# Altium schematic symbol library jlcpcb_2025_04_resistors_extended_0201.schlib: 1508 symbols (part 6 of 8) (continued)
## RC-01W5362FT (continued)

## RC-01W5490FT
designator R?  Resistance: 549Ω  (hidden comment: *)
Resistor, 549Ω, ±1%, 50mW, ±200ppm/℃, -55℃~+125℃, SMD 0201; Manufacturer: Uniroyal; Manufacturer Part Number: RC-01W5490FT; Supplier 1: LCSC; Supplier Part Number 1: C320954; JLCPCB Part Number: C320954; Power Rating: 50mW; Category: Resistors; Package Size: 0201; JLCPCB Basic Part: Yes; Tolerance: ±1%; Temperature Coefficient: ±200ppm/℃; Temperature Rating: -55℃~+125℃; ComponentLink1Description: Datasheet; ComponentLink1URL: https://wmsc.lcsc.com/wmsc/upload/file/pdf/v2/lcsc/2110191430_FH--Guangdong-Fenghua-Advanced-Tech-RC-01W5490FT_C320954.pdf; ComponentLink2Description: JLCPCB Part URL; ComponentLink2URL: https://jlcpcb.com/partdetail/C320954
pins: 1, 2
1 alternate drawing of the same symbol

## RC-01W5600FT
designator R?  Resistance: 560Ω  (hidden comment: *)
Resistor, 560Ω, ±1%, 50mW, 25V, ±200ppm/℃, -55℃~+125℃, SMD 0201; Manufacturer: Uniroyal; Manufacturer Part Number: RC-01W5600FT; Supplier 1: LCSC; Supplier Part Number 1: C320959; JLCPCB Part Number: C320959; Power Rating: 50mW; Category: Resistors; Package Size: 0201; JLCPCB Basic Part: Yes; Tolerance: ±1%; Voltage Rating: 25V; Temperature Coefficient: ±200ppm/℃; Temperature Rating: -55℃~+125℃; ComponentLink1Description: Datasheet; ComponentLink1URL: https://wmsc.lcsc.com/wmsc/upload/file/pdf/v2/lcsc/2304140030_FH--Guangdong-Fenghua-Advanced-Tech-RC-01W5600FT_C320959.pdf; ComponentLink2Description: JLCPCB Part URL; ComponentLink2URL: https://jlcpcb.com/partdetail/C320959
pins: 1, 2
1 alternate drawing of the same symbol

## RC-01W5620FT
designator R?  Resistance: 562Ω  (hidden comment: *)
Resistor, 562Ω, ±1%, 50mW, 25V, ±200ppm/℃, -55℃~+125℃, SMD 0201; Manufacturer: Uniroyal; Manufacturer Part Number: RC-01W5620FT; Supplier 1: LCSC; Supplier Part Number 1: C320964; JLCPCB Part Number: C320964; Power Rating: 50mW; Category: Resistors; Package Size: 0201; JLCPCB Basic Part: Yes; Tolerance: ±1%; Voltage Rating: 25V; Temperature Coefficient: ±200ppm/℃; Temperature Rating: -55℃~+125℃; ComponentLink1Description: Datasheet; ComponentLink1URL: https://wmsc.lcsc.com/wmsc/upload/file/pdf/v2/lcsc/2304140030_FH--Guangdong-Fenghua-Advanced-Tech-RC-01W5620FT_C320964.pdf; ComponentLink2Description: JLCPCB Part URL; ComponentLink2URL: https://jlcpcb.com/partdetail/C320964
pins: 1, 2
1 alternate drawing of the same symbol

## RC-01W5622FT
designator R?  Resistance: 56.2kΩ  (hidden comment: *)
Resistor, 56.2kΩ, ±1%, 50mW, 25V, ±200ppm/℃, -55℃~+125℃, SMD 0201; Manufacturer: Uniroyal; Manufacturer Part Number: RC-01W5622FT; Supplier 1: LCSC; Supplier Part Number 1: C320966; JLCPCB Part Number: C320966; Power Rating: 50mW; Category: Resistors; Package Size: 0201; JLCPCB Basic Part: Yes; Tolerance: ±1%; Voltage Rating: 25V; Temperature Coefficient: ±200ppm/℃; Temperature Rating: -55℃~+125℃; ComponentLink1Description: Datasheet; ComponentLink1URL: https://wmsc.lcsc.com/wmsc/upload/file/pdf/v2/lcsc/2304140030_FH--Guangdong-Fenghua-Advanced-Tech-RC-01W5622FT_C320966.pdf; ComponentLink2Description: JLCPCB Part URL; ComponentLink2URL: https://jlcpcb.com/partdetail/C320966
pins: 1, 2
1 alternate drawing of the same symbol

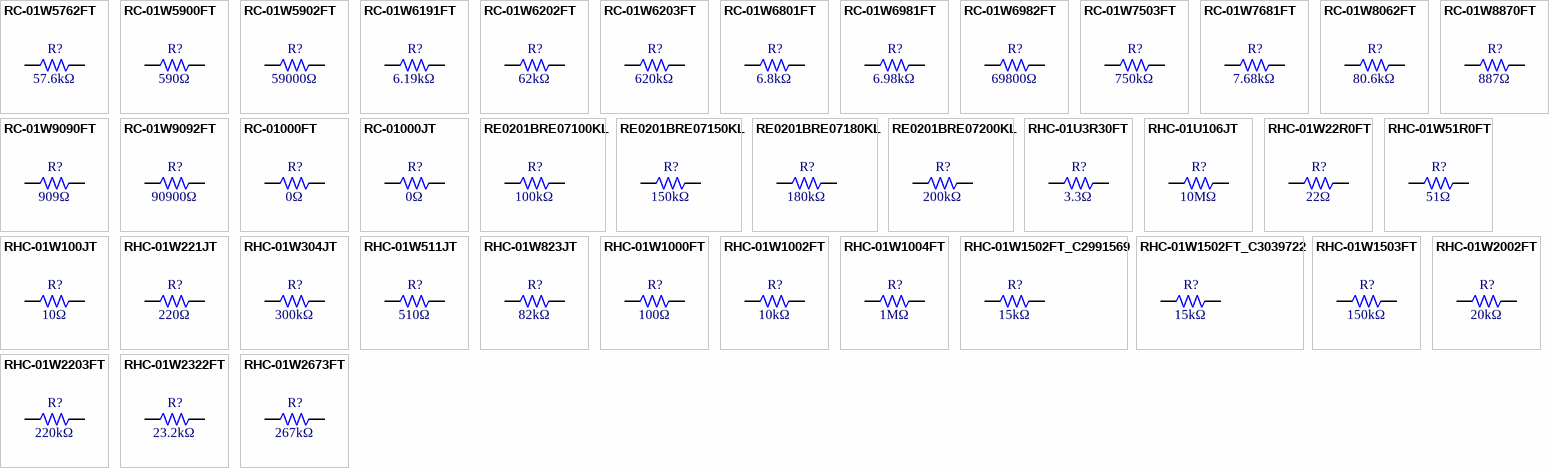
[diagram p27: symbols RC-01W5762FT to RHC-01W2673FT]

## RC-01W5762FT
designator R?  Resistance: 57.6kΩ  (hidden comment: *)
Resistor, 57.6kΩ, ±1%, 50mW, 25V, ±200ppm/℃, -55℃~+125℃, SMD 0201; Manufacturer: Uniroyal; Manufacturer Part Number: RC-01W5762FT; Supplier 1: LCSC; Supplier Part Number 1: C320974; JLCPCB Part Number: C320974; Power Rating: 50mW; Category: Resistors; Package Size: 0201; JLCPCB Basic Part: Yes; Tolerance: ±1%; Voltage Rating: 25V; Temperature Coefficient: ±200ppm/℃; Temperature Rating: -55℃~+125℃; ComponentLink1Description: Datasheet; ComponentLink1URL: https://wmsc.lcsc.com/wmsc/upload/file/pdf/v2/lcsc/2304140030_FH--Guangdong-Fenghua-Advanced-Tech-RC-01W5762FT_C320974.pdf; ComponentLink2Description: JLCPCB Part URL; ComponentLink2URL: https://jlcpcb.com/partdetail/C320974
pins: 1, 2
1 alternate drawing of the same symbol

## RC-01W5900FT
designator R?  Resistance: 590Ω  (hidden comment: *)
Resistor, 590Ω, ±1%, 50mW, ±200ppm/℃, -55℃~+125℃, SMD 0201; Manufacturer: Uniroyal; Manufacturer Part Number: RC-01W5900FT; Supplier 1: LCSC; Supplier Part Number 1: C320976; JLCPCB Part Number: C320976; Power Rating: 50mW; Category: Resistors; Package Size: 0201; JLCPCB Basic Part: Yes; Tolerance: ±1%; Temperature Coefficient: ±200ppm/℃; Temperature Rating: -55℃~+125℃; ComponentLink1Description: Datasheet; ComponentLink1URL: https://wmsc.lcsc.com/wmsc/upload/file/pdf/v2/lcsc/2202211530_FH--Guangdong-Fenghua-Advanced-Tech-RC-01W5900FT_C320976.pdf; ComponentLink2Description: JLCPCB Part URL; ComponentLink2URL: https://jlcpcb.com/partdetail/C320976
pins: 1, 2
1 alternate drawing of the same symbol

## RC-01W5902FT
designator R?  Resistance: 59000Ω  (hidden comment: *)
Resistor, 59000Ω, ±1%, 50mW, ±200ppm/℃, -55℃~+125℃, SMD 0201; Manufacturer: Uniroyal; Manufacturer Part Number: RC-01W5902FT; Supplier 1: LCSC; Supplier Part Number 1: C320978; JLCPCB Part Number: C320978; Power Rating: 50mW; Category: Resistors; Package Size: 0201; JLCPCB Basic Part: Yes; Tolerance: ±1%; Temperature Coefficient: ±200ppm/℃; Temperature Rating: -55℃~+125℃; ComponentLink1Description: Datasheet; ComponentLink1URL: https://wmsc.lcsc.com/wmsc/upload/file/pdf/v2/lcsc/2110191430_FH--Guangdong-Fenghua-Advanced-Tech-RC-01W5902FT_C320978.pdf; ComponentLink2Description: JLCPCB Part URL; ComponentLink2URL: https://jlcpcb.com/partdetail/C320978
pins: 1, 2
1 alternate drawing of the same symbol

## RC-01W6191FT
designator R?  Resistance: 6.19kΩ  (hidden comment: *)
Resistor, 6.19kΩ, ±1%, 50mW, 25V, ±200ppm/℃, -55℃~+125℃, SMD 0201; Manufacturer: Uniroyal; Manufacturer Part Number: RC-01W6191FT; Supplier 1: LCSC; Supplier Part Number 1: C320984; JLCPCB Part Number: C320984; Power Rating: 50mW; Category: Resistors; Package Size: 0201; JLCPCB Basic Part: Yes; Tolerance: ±1%; Voltage Rating: 25V; Temperature Coefficient: ±200ppm/℃; Temperature Rating: -55℃~+125℃; ComponentLink1Description: Datasheet; ComponentLink1URL: https://wmsc.lcsc.com/wmsc/upload/file/pdf/v2/lcsc/2304140030_FH--Guangdong-Fenghua-Advanced-Tech-RC-01W6191FT_C320984.pdf; ComponentLink2Description: JLCPCB Part URL; ComponentLink2URL: https://jlcpcb.com/partdetail/C320984
pins: 1, 2
1 alternate drawing of the same symbol

## RC-01W6202FT
designator R?  Resistance: 62kΩ  (hidden comment: *)
Resistor, 62kΩ, ±1%, 50mW, 25V, ±200ppm/℃, -55℃~+125℃, SMD 0201; Manufacturer: Uniroyal; Manufacturer Part Number: RC-01W6202FT; Supplier 1: LCSC; Supplier Part Number 1: C320989; JLCPCB Part Number: C320989; Power Rating: 50mW; Category: Resistors; Package Size: 0201; JLCPCB Basic Part: Yes; Tolerance: ±1%; Voltage Rating: 25V; Temperature Coefficient: ±200ppm/℃; Temperature Rating: -55℃~+125℃; ComponentLink1Description: Datasheet; ComponentLink1URL: https://wmsc.lcsc.com/wmsc/upload/file/pdf/v2/lcsc/2304140030_FH--Guangdong-Fenghua-Advanced-Tech-RC-01W6202FT_C320989.pdf; ComponentLink2Description: JLCPCB Part URL; ComponentLink2URL: https://jlcpcb.com/partdetail/C320989
pins: 1, 2
1 alternate drawing of the same symbol

## RC-01W6203FT
designator R?  Resistance: 620kΩ  (hidden comment: *)
Resistor, 620kΩ, ±1%, 50mW, 25V, ±200ppm/℃, -55℃~+125℃, SMD 0201; Manufacturer: Uniroyal; Manufacturer Part Number: RC-01W6203FT; Supplier 1: LCSC; Supplier Part Number 1: C320990; JLCPCB Part Number: C320990; Power Rating: 50mW; Category: Resistors; Package Size: 0201; JLCPCB Basic Part: Yes; Tolerance: ±1%; Voltage Rating: 25V; Temperature Coefficient: ±200ppm/℃; Temperature Rating: -55℃~+125℃; ComponentLink1Description: Datasheet; ComponentLink1URL: https://wmsc.lcsc.com/wmsc/upload/file/pdf/v2/lcsc/2304140030_FH--Guangdong-Fenghua-Advanced-Tech-RC-01W6203FT_C320990.pdf; ComponentLink2Description: JLCPCB Part URL; ComponentLink2URL: https://jlcpcb.com/partdetail/C320990
pins: 1, 2
1 alternate drawing of the same symbol

## RC-01W6801FT
designator R?  Resistance: 6.8kΩ  (hidden comment: *)
Resistor, 6.8kΩ, ±1%, 50mW, 25V, ±200ppm/℃, -55℃~+125℃, SMD 0201; Manufacturer: Uniroyal; Manufacturer Part Number: RC-01W6801FT; Supplier 1: LCSC; Supplier Part Number 1: C321006; JLCPCB Part Number: C321006; Power Rating: 50mW; Category: Resistors; Package Size: 0201; JLCPCB Basic Part: Yes; Tolerance: ±1%; Voltage Rating: 25V; Temperature Coefficient: ±200ppm/℃; Temperature Rating: -55℃~+125℃; ComponentLink1Description: Datasheet; ComponentLink1URL: https://wmsc.lcsc.com/wmsc/upload/file/pdf/v2/lcsc/2304140030_FH--Guangdong-Fenghua-Advanced-Tech-RC-01W6801FT_C321006.pdf; ComponentLink2Description: JLCPCB Part URL; ComponentLink2URL: https://jlcpcb.com/partdetail/C321006
pins: 1, 2
1 alternate drawing of the same symbol

## RC-01W6981FT
designator R?  Resistance: 6.98kΩ  (hidden comment: *)
Resistor, 6.98kΩ, ±1%, 50mW, 25V, ±200ppm/℃, -55℃~+125℃, SMD 0201; Manufacturer: Uniroyal; Manufacturer Part Number: RC-01W6981FT; Supplier 1: LCSC; Supplier Part Number 1: C321018; JLCPCB Part Number: C321018; Power Rating: 50mW; Category: Resistors; Package Size: 0201; JLCPCB Basic Part: Yes; Tolerance: ±1%; Voltage Rating: 25V; Temperature Coefficient: ±200ppm/℃; Temperature Rating: -55℃~+125℃; ComponentLink1Description: Datasheet; ComponentLink1URL: https://wmsc.lcsc.com/wmsc/upload/file/pdf/v2/lcsc/2304140030_FH--Guangdong-Fenghua-Advanced-Tech-RC-01W6981FT_C321018.pdf; ComponentLink2Description: JLCPCB Part URL; ComponentLink2URL: https://jlcpcb.com/partdetail/C321018
pins: 1, 2
1 alternate drawing of the same symbol

## RC-01W6982FT
designator R?  Resistance: 69800Ω  (hidden comment: *)
Resistor, 69800Ω, ±1%, 50mW, ±200ppm/℃, -55℃~+125℃, SMD 0201; Manufacturer: Uniroyal; Manufacturer Part Number: RC-01W6982FT; Supplier 1: LCSC; Supplier Part Number 1: C321019; JLCPCB Part Number: C321019; Power Rating: 50mW; Category: Resistors; Package Size: 0201; JLCPCB Basic Part: Yes; Tolerance: ±1%; Temperature Coefficient: ±200ppm/℃; Temperature Rating: -55℃~+125℃; ComponentLink1Description: Datasheet; ComponentLink1URL: https://wmsc.lcsc.com/wmsc/upload/file/pdf/v2/lcsc/2202211530_FH--Guangdong-Fenghua-Advanced-Tech-RC-01W6982FT_C321019.pdf; ComponentLink2Description: JLCPCB Part URL; ComponentLink2URL: https://jlcpcb.com/partdetail/C321019
pins: 1, 2
1 alternate drawing of the same symbol

## RC-01W7503FT
designator R?  Resistance: 750kΩ  (hidden comment: *)
Resistor, 750kΩ, ±1%, 50mW, 25V, ±200ppm/℃, -55℃~+125℃, SMD 0201; Manufacturer: Uniroyal; Manufacturer Part Number: RC-01W7503FT; Supplier 1: LCSC; Supplier Part Number 1: C321031; JLCPCB Part Number: C321031; Power Rating: 50mW; Category: Resistors; Package Size: 0201; JLCPCB Basic Part: Yes; Tolerance: ±1%; Voltage Rating: 25V; Temperature Coefficient: ±200ppm/℃; Temperature Rating: -55℃~+125℃; ComponentLink1Description: Datasheet; ComponentLink1URL: https://wmsc.lcsc.com/wmsc/upload/file/pdf/v2/lcsc/2304140030_FH--Guangdong-Fenghua-Advanced-Tech-RC-01W7503FT_C321031.pdf; ComponentLink2Description: JLCPCB Part URL; ComponentLink2URL: https://jlcpcb.com/partdetail/C321031
pins: 1, 2
1 alternate drawing of the same symbol

## RC-01W7681FT
designator R?  Resistance: 7.68kΩ  (hidden comment: *)
Resistor, 7.68kΩ, ±1%, ±200ppm/℃, SMD 0201; Manufacturer: Uniroyal; Manufacturer Part Number: RC-01W7681FT; Supplier 1: LCSC; Supplier Part Number 1: C321038; JLCPCB Part Number: C321038; Category: Resistors; Package Size: 0201; JLCPCB Basic Part: Yes; Tolerance: ±1%; Temperature Coefficient: ±200ppm/℃; ComponentLink1Description: Datasheet; ComponentLink1URL: https://wmsc.lcsc.com/wmsc/upload/file/pdf/v2/lcsc/2206282015_FH--Guangdong-Fenghua-Advanced-Tech-RC-01W7681FT_C321038.pdf; ComponentLink2Description: JLCPCB Part URL; ComponentLink2URL: https://jlcpcb.com/partdetail/C321038
pins: 1, 2
1 alternate drawing of the same symbol

## RC-01W8062FT
designator R?  Resistance: 80.6kΩ  (hidden comment: *)
Resistor, 80.6kΩ, ±1%, 50mW, 25V, ±200ppm/℃, -55℃~+125℃, SMD 0201; Manufacturer: Uniroyal; Manufacturer Part Number: RC-01W8062FT; Supplier 1: LCSC; Supplier Part Number 1: C321047; JLCPCB Part Number: C321047; Power Rating: 50mW; Category: Resistors; Package Size: 0201; JLCPCB Basic Part: Yes; Tolerance: ±1%; Voltage Rating: 25V; Temperature Coefficient: ±200ppm/℃; Temperature Rating: -55℃~+125℃; ComponentLink1Description: Datasheet; ComponentLink1URL: https://wmsc.lcsc.com/wmsc/upload/file/pdf/v2/lcsc/2304140030_FH--Guangdong-Fenghua-Advanced-Tech-RC-01W8062FT_C321047.pdf; ComponentLink2Description: JLCPCB Part URL; ComponentLink2URL: https://jlcpcb.com/partdetail/C321047
pins: 1, 2
1 alternate drawing of the same symbol

## RC-01W8870FT
designator R?  Resistance: 887Ω  (hidden comment: *)
Resistor, 887Ω, ±1%, ±200ppm/℃, SMD 0201; Manufacturer: Uniroyal; Manufacturer Part Number: RC-01W8870FT; Supplier 1: LCSC; Supplier Part Number 1: C321073; JLCPCB Part Number: C321073; Category: Resistors; Package Size: 0201; JLCPCB Basic Part: Yes; Tolerance: ±1%; Temperature Coefficient: ±200ppm/℃; ComponentLink1Description: Datasheet; ComponentLink1URL: https://wmsc.lcsc.com/wmsc/upload/file/pdf/v2/lcsc/2204121100_FH--Guangdong-Fenghua-Advanced-Tech-RC-01W8870FT_C321073.pdf; ComponentLink2Description: JLCPCB Part URL; ComponentLink2URL: https://jlcpcb.com/partdetail/C321073
pins: 1, 2
1 alternate drawing of the same symbol

## RC-01W9090FT
designator R?  Resistance: 909Ω  (hidden comment: *)
Resistor, 909Ω, ±1%, 50mW, 25V, ±200ppm/℃, -55℃~+125℃, SMD 0201; Manufacturer: Uniroyal; Manufacturer Part Number: RC-01W9090FT; Supplier 1: LCSC; Supplier Part Number 1: C321078; JLCPCB Part Number: C321078; Power Rating: 50mW; Category: Resistors; Package Size: 0201; JLCPCB Basic Part: Yes; Tolerance: ±1%; Voltage Rating: 25V; Temperature Coefficient: ±200ppm/℃; Temperature Rating: -55℃~+125℃; ComponentLink1Description: Datasheet; ComponentLink1URL: https://wmsc.lcsc.com/wmsc/upload/file/pdf/v2/lcsc/2304140030_FH--Guangdong-Fenghua-Advanced-Tech-RC-01W9090FT_C321078.pdf; ComponentLink2Description: JLCPCB Part URL; ComponentLink2URL: https://jlcpcb.com/partdetail/C321078
pins: 1, 2
1 alternate drawing of the same symbol

## RC-01W9092FT
designator R?  Resistance: 90900Ω  (hidden comment: *)
Resistor, 90900Ω, ±1%, 50mW, 25V, ±200ppm/℃, -55℃~+125℃, SMD 0201; Manufacturer: Uniroyal; Manufacturer Part Number: RC-01W9092FT; Supplier 1: LCSC; Supplier Part Number 1: C321080; JLCPCB Part Number: C321080; Power Rating: 50mW; Category: Resistors; Package Size: 0201; JLCPCB Basic Part: Yes; Tolerance: ±1%; Voltage Rating: 25V; Temperature Coefficient: ±200ppm/℃; Temperature Rating: -55℃~+125℃; ComponentLink1Description: Datasheet; ComponentLink1URL: https://wmsc.lcsc.com/wmsc/upload/file/pdf/v2/lcsc/2304140030_FH--Guangdong-Fenghua-Advanced-Tech-RC-01W9092FT_C321080.pdf; ComponentLink2Description: JLCPCB Part URL; ComponentLink2URL: https://jlcpcb.com/partdetail/C321080
pins: 1, 2
1 alternate drawing of the same symbol

## RC-01000FT
designator R?  Resistance: 0Ω  (hidden comment: *)
Resistor, 0Ω, ±1%, 50mW, 25V, -55℃~+125℃, SMD 0201; Manufacturer: Uniroyal; Manufacturer Part Number: RC-01000FT; Supplier 1: LCSC; Supplier Part Number 1: C320450; JLCPCB Part Number: C320450; Power Rating: 50mW; Category: Resistors; Package Size: 0201; JLCPCB Basic Part: Yes; Tolerance: ±1%; Voltage Rating: 25V; Temperature Rating: -55℃~+125℃; ComponentLink1Description: Datasheet; ComponentLink1URL: https://wmsc.lcsc.com/wmsc/upload/file/pdf/v2/lcsc/2304140030_FH--Guangdong-Fenghua-Advanced-Tech-RC-01000FT_C320450.pdf; ComponentLink2Description: JLCPCB Part URL; ComponentLink2URL: https://jlcpcb.com/partdetail/C320450
pins: 1, 2
1 alternate drawing of the same symbol

## RC-01000JT
designator R?  Resistance: 0Ω  (hidden comment: *)
Resistor, 0Ω, ±5%, 50mW, 25V, -55℃~+125℃, SMD 0201; Manufacturer: Uniroyal; Manufacturer Part Number: RC-01000JT; Supplier 1: LCSC; Supplier Part Number 1: C310170; JLCPCB Part Number: C310170; Power Rating: 50mW; Category: Resistors; Package Size: 0201; JLCPCB Basic Part: Yes; Tolerance: ±5%; Voltage Rating: 25V; Temperature Rating: -55℃~+125℃; ComponentLink1Description: Datasheet; ComponentLink1URL: https://wmsc.lcsc.com/wmsc/upload/file/pdf/v2/lcsc/2406111438_FH--Guangdong-Fenghua-Advanced-Tech-RC-01000JT_C310170.pdf; ComponentLink2Description: JLCPCB Part URL; ComponentLink2URL: https://jlcpcb.com/partdetail/C310170
pins: 1, 2
1 alternate drawing of the same symbol

## RE0201BRE07100KL
designator R?  Resistance: 100kΩ  (hidden comment: *)
Resistor, 100kΩ, ±0.1%, 50mW, 25V, ±50ppm/℃, -55℃~+155℃, SMD 0201; Manufacturer: Uniroyal; Manufacturer Part Number: RE0201BRE07100KL; Supplier 1: LCSC; Supplier Part Number 1: C1882654; JLCPCB Part Number: C1882654; Power Rating: 50mW; Category: Resistors; Package Size: 0201; JLCPCB Basic Part: Yes; Tolerance: ±0.1%; Voltage Rating: 25V; Temperature Coefficient: ±50ppm/℃; Temperature Rating: -55℃~+155℃; ComponentLink1Description: Datasheet; ComponentLink1URL: https://wmsc.lcsc.com/wmsc/upload/file/pdf/v2/lcsc/2201280400_YAGEO-RE0201BRE07100KL_C1882654.pdf; ComponentLink2Description: JLCPCB Part URL; ComponentLink2URL: https://jlcpcb.com/partdetail/C1882654
pins: 1, 2
1 alternate drawing of the same symbol

## RE0201BRE07150KL
designator R?  Resistance: 150kΩ  (hidden comment: *)
Resistor, 150kΩ, ±0.1%, 50mW, 25V, ±50ppm/℃, -55℃~+155℃, SMD 0201; Manufacturer: Uniroyal; Manufacturer Part Number: RE0201BRE07150KL; Supplier 1: LCSC; Supplier Part Number 1: C2145638; JLCPCB Part Number: C2145638; Power Rating: 50mW; Category: Resistors; Package Size: 0201; JLCPCB Basic Part: Yes; Tolerance: ±0.1%; Voltage Rating: 25V; Temperature Coefficient: ±50ppm/℃; Temperature Rating: -55℃~+155℃; ComponentLink1Description: Datasheet; ComponentLink1URL: https://wmsc.lcsc.com/wmsc/upload/file/pdf/v2/lcsc/2202031530_YAGEO-RE0201BRE07150KL_C2145638.pdf; ComponentLink2Description: JLCPCB Part URL; ComponentLink2URL: https://jlcpcb.com/partdetail/C2145638
pins: 1, 2
1 alternate drawing of the same symbol

## RE0201BRE07180KL
designator R?  Resistance: 180kΩ  (hidden comment: *)
Resistor, 180kΩ, ±0.1%, 50mW, 25V, ±50ppm/℃, -55℃~+155℃, SMD 0201; Manufacturer: Uniroyal; Manufacturer Part Number: RE0201BRE07180KL; Supplier 1: LCSC; Supplier Part Number 1: C2936622; JLCPCB Part Number: C2936622; Power Rating: 50mW; Category: Resistors; Package Size: 0201; JLCPCB Basic Part: Yes; Tolerance: ±0.1%; Voltage Rating: 25V; Temperature Coefficient: ±50ppm/℃; Temperature Rating: -55℃~+155℃; ComponentLink1Description: Datasheet; ComponentLink1URL: https://wmsc.lcsc.com/wmsc/upload/file/pdf/v2/lcsc/2201121730_YAGEO-RE0201BRE07180KL_C2936622.pdf; ComponentLink2Description: JLCPCB Part URL; ComponentLink2URL: https://jlcpcb.com/partdetail/C2936622
pins: 1, 2
1 alternate drawing of the same symbol

## RE0201BRE07200KL
designator R?  Resistance: 200kΩ  (hidden comment: *)
Resistor, 200kΩ, ±0.1%, 50mW, 25V, ±50ppm/℃, -55℃~+155℃, SMD 0201; Manufacturer: Uniroyal; Manufacturer Part Number: RE0201BRE07200KL; Supplier 1: LCSC; Supplier Part Number 1: C2088422; JLCPCB Part Number: C2088422; Power Rating: 50mW; Category: Resistors; Package Size: 0201; JLCPCB Basic Part: Yes; Tolerance: ±0.1%; Voltage Rating: 25V; Temperature Coefficient: ±50ppm/℃; Temperature Rating: -55℃~+155℃; ComponentLink1Description: Datasheet; ComponentLink1URL: https://wmsc.lcsc.com/wmsc/upload/file/pdf/v2/lcsc/2202020100_YAGEO-RE0201BRE07200KL_C2088422.pdf; ComponentLink2Description: JLCPCB Part URL; ComponentLink2URL: https://jlcpcb.com/partdetail/C2088422
pins: 1, 2
1 alternate drawing of the same symbol

## RHC-01U3R30FT
designator R?  Resistance: 3.3Ω  (hidden comment: *)
Resistor, 3.3Ω, ±1%, ±400ppm/℃, SMD 0201; Manufacturer: Uniroyal; Manufacturer Part Number: RHC-01U3R30FT; Supplier 1: LCSC; Supplier Part Number 1: C4354887; JLCPCB Part Number: C4354887; Category: Resistors; Package Size: 0201; JLCPCB Basic Part: Yes; Tolerance: ±1%; Temperature Coefficient: ±400ppm/℃; ComponentLink1Description: Datasheet; ComponentLink1URL: https://wmsc.lcsc.com/wmsc/upload/file/pdf/v2/lcsc/2207131800_FH--Guangdong-Fenghua-Advanced-Tech-RHC-01U3R30FT_C4354887.pdf; ComponentLink2Description: JLCPCB Part URL; ComponentLink2URL: https://jlcpcb.com/partdetail/C4354887
pins: 1, 2
1 alternate drawing of the same symbol

## RHC-01U106JT
designator R?  Resistance: 10MΩ  (hidden comment: *)
Resistor, 10MΩ, ±5%, 50mW, 25V, ±400ppm/℃, -55℃~+155℃, SMD 0201; Manufacturer: Uniroyal; Manufacturer Part Number: RHC-01U106JT; Supplier 1: LCSC; Supplier Part Number 1: C2991657; JLCPCB Part Number: C2991657; Power Rating: 50mW; Category: Resistors; Package Size: 0201; JLCPCB Basic Part: Yes; Tolerance: ±5%; Voltage Rating: 25V; Temperature Coefficient: ±400ppm/℃; Temperature Rating: -55℃~+155℃; ComponentLink1Description: Datasheet; ComponentLink1URL: https://wmsc.lcsc.com/wmsc/upload/file/pdf/v2/lcsc/2204111815_FH--Guangdong-Fenghua-Advanced-Tech-RHC-01U106JT_C2991657.pdf; ComponentLink2Description: JLCPCB Part URL; ComponentLink2URL: https://jlcpcb.com/partdetail/C2991657
pins: 1, 2
1 alternate drawing of the same symbol

## RHC-01W22R0FT
designator R?  Resistance: 22Ω  (hidden comment: *)
Resistor, 22Ω, ±1%, 50mW, 25V, ±200ppm/℃, -55℃~+155℃, SMD 0201; Manufacturer: Uniroyal; Manufacturer Part Number: RHC-01W22R0FT; Supplier 1: LCSC; Supplier Part Number 1: C2991689; JLCPCB Part Number: C2991689; Power Rating: 50mW; Category: Resistors; Package Size: 0201; JLCPCB Basic Part: Yes; Tolerance: ±1%; Voltage Rating: 25V; Temperature Coefficient: ±200ppm/℃; Temperature Rating: -55℃~+155℃; ComponentLink1Description: Datasheet; ComponentLink1URL: https://wmsc.lcsc.com/wmsc/upload/file/pdf/v2/lcsc/2204111815_FH--Guangdong-Fenghua-Advanced-Tech-RHC-01W22R0FT_C2991689.pdf; ComponentLink2Description: JLCPCB Part URL; ComponentLink2URL: https://jlcpcb.com/partdetail/C2991689
pins: 1, 2
1 alternate drawing of the same symbol

## RHC-01W51R0FT
designator R?  Resistance: 51Ω  (hidden comment: *)
Resistor, 51Ω, ±1%, ±200ppm/℃, SMD 0201; Manufacturer: Uniroyal; Manufacturer Part Number: RHC-01W51R0FT; Supplier 1: LCSC; Supplier Part Number 1: C5355217; JLCPCB Part Number: C5355217; Category: Resistors; Package Size: 0201; JLCPCB Basic Part: Yes; Tolerance: ±1%; Temperature Coefficient: ±200ppm/℃; ComponentLink1Description: Datasheet; ComponentLink1URL: https://wmsc.lcsc.com/wmsc/upload/file/pdf/v2/lcsc/2302141100_FH--Guangdong-Fenghua-Advanced-Tech-RHC-01W51R0FT_C5355217.pdf; ComponentLink2Description: JLCPCB Part URL; ComponentLink2URL: https://jlcpcb.com/partdetail/C5355217
pins: 1, 2
1 alternate drawing of the same symbol

## RHC-01W100JT
designator R?  Resistance: 10Ω  (hidden comment: *)
Resistor, 10Ω, ±3%, 50mW, 25V, ±200ppm/℃, -55℃~+155℃, SMD 0201; Manufacturer: Uniroyal; Manufacturer Part Number: RHC-01W100JT; Supplier 1: LCSC; Supplier Part Number 1: C2991624; JLCPCB Part Number: C2991624; Power Rating: 50mW; Category: Resistors; Package Size: 0201; JLCPCB Basic Part: Yes; Tolerance: ±3%; Voltage Rating: 25V; Temperature Coefficient: ±200ppm/℃; Temperature Rating: -55℃~+155℃; ComponentLink1Description: Datasheet; ComponentLink1URL: https://wmsc.lcsc.com/wmsc/upload/file/pdf/v2/lcsc/2204111630_FH--Guangdong-Fenghua-Advanced-Tech-RHC-01W100JT_C2991624.pdf; ComponentLink2Description: JLCPCB Part URL; ComponentLink2URL: https://jlcpcb.com/partdetail/C2991624
pins: 1, 2
1 alternate drawing of the same symbol

## RHC-01W221JT
designator R?  Resistance: 220Ω  (hidden comment: *)
Resistor, 220Ω, ±5%, 50mW, 25V, ±200ppm/℃, -55℃~+155℃, SMD 0201; Manufacturer: Uniroyal; Manufacturer Part Number: RHC-01W221JT; Supplier 1: LCSC; Supplier Part Number 1: C2991660; JLCPCB Part Number: C2991660; Power Rating: 50mW; Category: Resistors; Package Size: 0201; JLCPCB Basic Part: Yes; Tolerance: ±5%; Voltage Rating: 25V; Temperature Coefficient: ±200ppm/℃; Temperature Rating: -55℃~+155℃; ComponentLink1Description: Datasheet; ComponentLink1URL: https://wmsc.lcsc.com/wmsc/upload/file/pdf/v2/lcsc/2204111630_FH--Guangdong-Fenghua-Advanced-Tech-RHC-01W221JT_C2991660.pdf; ComponentLink2Description: JLCPCB Part URL; ComponentLink2URL: https://jlcpcb.com/partdetail/C2991660
pins: 1, 2
1 alternate drawing of the same symbol

## RHC-01W304JT
designator R?  Resistance: 300kΩ  (hidden comment: *)
Resistor, 300kΩ, ±5%, 50mW, 25V, ±200ppm/℃, -55℃~+155℃, SMD 0201; Manufacturer: Uniroyal; Manufacturer Part Number: RHC-01W304JT; Supplier 1: LCSC; Supplier Part Number 1: C2991653; JLCPCB Part Number: C2991653; Power Rating: 50mW; Category: Resistors; Package Size: 0201; JLCPCB Basic Part: Yes; Tolerance: ±5%; Voltage Rating: 25V; Temperature Coefficient: ±200ppm/℃; Temperature Rating: -55℃~+155℃; ComponentLink1Description: Datasheet; ComponentLink1URL: https://wmsc.lcsc.com/wmsc/upload/file/pdf/v2/lcsc/2204111630_FH--Guangdong-Fenghua-Advanced-Tech-RHC-01W304JT_C2991653.pdf; ComponentLink2Description: JLCPCB Part URL; ComponentLink2URL: https://jlcpcb.com/partdetail/C2991653
pins: 1, 2
1 alternate drawing of the same symbol

## RHC-01W511JT
designator R?  Resistance: 510Ω  (hidden comment: *)
Resistor, 510Ω, ±5%, SMD 0201; Manufacturer: Uniroyal; Manufacturer Part Number: RHC-01W511JT; Supplier 1: LCSC; Supplier Part Number 1: C5119984; JLCPCB Part Number: C5119984; Category: Resistors; Package Size: 0201; JLCPCB Basic Part: Yes; Tolerance: ±5%; ComponentLink1Description: Datasheet; ComponentLink1URL: https://wmsc.lcsc.com/wmsc/upload/file/pdf/v2/lcsc/2208300930_FH--Guangdong-Fenghua-Advanced-Tech-RHC-01W511JT_C5119984.pdf; ComponentLink2Description: JLCPCB Part URL; ComponentLink2URL: https://jlcpcb.com/partdetail/C5119984
pins: 1, 2
1 alternate drawing of the same symbol

## RHC-01W823JT
designator R?  Resistance: 82kΩ  (hidden comment: *)
Resistor, 82kΩ, ±5%, ±200ppm/℃, SMD 0201; Manufacturer: Uniroyal; Manufacturer Part Number: RHC-01W823JT; Supplier 1: LCSC; Supplier Part Number 1: C5355262; JLCPCB Part Number: C5355262; Category: Resistors; Package Size: 0201; JLCPCB Basic Part: Yes; Tolerance: ±5%; Temperature Coefficient: ±200ppm/℃; ComponentLink1Description: Datasheet; ComponentLink1URL: https://wmsc.lcsc.com/wmsc/upload/file/pdf/v2/lcsc/2302141100_FH--Guangdong-Fenghua-Advanced-Tech-RHC-01W823JT_C5355262.pdf; ComponentLink2Description: JLCPCB Part URL; ComponentLink2URL: https://jlcpcb.com/partdetail/C5355262
pins: 1, 2
1 alternate drawing of the same symbol

## RHC-01W1000FT
designator R?  Resistance: 100Ω  (hidden comment: *)
Resistor, 100Ω, ±1%, 50mW, 25V, ±200ppm/℃, -55℃~+155℃, SMD 0201; Manufacturer: Uniroyal; Manufacturer Part Number: RHC-01W1000FT; Supplier 1: LCSC; Supplier Part Number 1: C2991668; JLCPCB Part Number: C2991668; Power Rating: 50mW; Category: Resistors; Package Size: 0201; JLCPCB Basic Part: Yes; Tolerance: ±1%; Voltage Rating: 25V; Temperature Coefficient: ±200ppm/℃; Temperature Rating: -55℃~+155℃; ComponentLink1Description: Datasheet; ComponentLink1URL: https://wmsc.lcsc.com/wmsc/upload/file/pdf/v2/lcsc/2204111815_FH--Guangdong-Fenghua-Advanced-Tech-RHC-01W1000FT_C2991668.pdf; ComponentLink2Description: JLCPCB Part URL; ComponentLink2URL: https://jlcpcb.com/partdetail/C2991668
pins: 1, 2
1 alternate drawing of the same symbol

## RHC-01W1002FT
designator R?  Resistance: 10kΩ  (hidden comment: *)
Resistor, 10kΩ, ±1%, 50mW, 25V, ±200ppm/℃, -55℃~+155℃, SMD 0201; Manufacturer: Uniroyal; Manufacturer Part Number: RHC-01W1002FT; Supplier 1: LCSC; Supplier Part Number 1: C2991718; JLCPCB Part Number: C2991718; Power Rating: 50mW; Category: Resistors; Package Size: 0201; JLCPCB Basic Part: Yes; Tolerance: ±1%; Voltage Rating: 25V; Temperature Coefficient: ±200ppm/℃; Temperature Rating: -55℃~+155℃; ComponentLink1Description: Datasheet; ComponentLink1URL: https://wmsc.lcsc.com/wmsc/upload/file/pdf/v2/lcsc/2204111630_FH--Guangdong-Fenghua-Advanced-Tech-RHC-01W1002FT_C2991718.pdf; ComponentLink2Description: JLCPCB Part URL; ComponentLink2URL: https://jlcpcb.com/partdetail/C2991718
pins: 1, 2
1 alternate drawing of the same symbol

## RHC-01W1004FT
designator R?  Resistance: 1MΩ  (hidden comment: *)
Resistor, 1MΩ, ±1%, 50mW, 25V, ±200ppm/℃, -55℃~+155℃, SMD 0201; Manufacturer: Uniroyal; Manufacturer Part Number: RHC-01W1004FT; Supplier 1: LCSC; Supplier Part Number 1: C2991645; JLCPCB Part Number: C2991645; Power Rating: 50mW; Category: Resistors; Package Size: 0201; JLCPCB Basic Part: Yes; Tolerance: ±1%; Voltage Rating: 25V; Temperature Coefficient: ±200ppm/℃; Temperature Rating: -55℃~+155℃; ComponentLink1Description: Datasheet; ComponentLink1URL: https://wmsc.lcsc.com/wmsc/upload/file/pdf/v2/lcsc/2204111815_FH--Guangdong-Fenghua-Advanced-Tech-RHC-01W1004FT_C2991645.pdf; ComponentLink2Description: JLCPCB Part URL; ComponentLink2URL: https://jlcpcb.com/partdetail/C2991645
pins: 1, 2
1 alternate drawing of the same symbol

## RHC-01W1502FT_C2991569
designator R?  Resistance: 15kΩ  (hidden comment: *)
Resistor, 15kΩ, ±1%, 50mW, 25V, ±200ppm/℃, -55℃~+155℃, SMD 0201; Manufacturer: Uniroyal; Manufacturer Part Number: RHC-01W1502FT; Supplier 1: LCSC; Supplier Part Number 1: C2991569; JLCPCB Part Number: C2991569; Power Rating: 50mW; Category: Resistors; Package Size: 0201; JLCPCB Basic Part: Yes; Tolerance: ±1%; Voltage Rating: 25V; Temperature Coefficient: ±200ppm/℃; Temperature Rating: -55℃~+155℃; ComponentLink1Description: Datasheet; ComponentLink1URL: https://wmsc.lcsc.com/wmsc/upload/file/pdf/v2/lcsc/2204111630_FH--Guangdong-Fenghua-Advanced-Tech-RHC-01W1502FT_C2991569.pdf; ComponentLink2Description: JLCPCB Part URL; ComponentLink2URL: https://jlcpcb.com/partdetail/C2991569
pins: 1, 2
1 alternate drawing of the same symbol

## RHC-01W1502FT_C3039722
designator R?  Resistance: 15kΩ  (hidden comment: *)
Resistor, 15kΩ, ±1%, ±200ppm/℃, SMD 0201; Manufacturer: Uniroyal; Manufacturer Part Number: RHC-01W1502FT; Supplier 1: LCSC; Supplier Part Number 1: C3039722; JLCPCB Part Number: C3039722; Category: Resistors; Package Size: 0201; JLCPCB Basic Part: Yes; Tolerance: ±1%; Temperature Coefficient: ±200ppm/℃; ComponentLink1Description: Datasheet; ComponentLink1URL: https://wmsc.lcsc.com/wmsc/upload/file/pdf/v2/lcsc/2206161145_FH--Guangdong-Fenghua-Advanced-Tech-RHC-01W1502FT_C3039722.pdf; ComponentLink2Description: JLCPCB Part URL; ComponentLink2URL: https://jlcpcb.com/partdetail/C3039722
pins: 1, 2
1 alternate drawing of the same symbol

## RHC-01W1503FT
designator R?  Resistance: 150kΩ  (hidden comment: *)
Resistor, 150kΩ, ±1%, 50mW, ±200ppm/℃, SMD 0201; Manufacturer: Uniroyal; Manufacturer Part Number: RHC-01W1503FT; Supplier 1: LCSC; Supplier Part Number 1: C880275; JLCPCB Part Number: C880275; Power Rating: 50mW; Category: Resistors; Package Size: 0201; JLCPCB Basic Part: Yes; Tolerance: ±1%; Temperature Coefficient: ±200ppm/℃; ComponentLink1Description: Datasheet; ComponentLink1URL: https://wmsc.lcsc.com/wmsc/upload/file/pdf/v2/lcsc/2011031038_FH--Guangdong-Fenghua-Advanced-Tech-RHC-01W1503FT_C880275.pdf; ComponentLink2Description: JLCPCB Part URL; ComponentLink2URL: https://jlcpcb.com/partdetail/C880275
pins: 1, 2
1 alternate drawing of the same symbol

## RHC-01W2002FT
designator R?  Resistance: 20kΩ  (hidden comment: *)
Resistor, 20kΩ, ±1%, 50mW, 25V, ±200ppm/℃, -55℃~+155℃, SMD 0201; Manufacturer: Uniroyal; Manufacturer Part Number: RHC-01W2002FT; Supplier 1: LCSC; Supplier Part Number 1: C2991587; JLCPCB Part Number: C2991587; Power Rating: 50mW; Category: Resistors; Package Size: 0201; JLCPCB Basic Part: Yes; Tolerance: ±1%; Voltage Rating: 25V; Temperature Coefficient: ±200ppm/℃; Temperature Rating: -55℃~+155℃; ComponentLink1Description: Datasheet; ComponentLink1URL: https://wmsc.lcsc.com/wmsc/upload/file/pdf/v2/lcsc/2204111815_FH--Guangdong-Fenghua-Advanced-Tech-RHC-01W2002FT_C2991587.pdf; ComponentLink2Description: JLCPCB Part URL; ComponentLink2URL: https://jlcpcb.com/partdetail/C2991587
pins: 1, 2
1 alternate drawing of the same symbol

## RHC-01W2203FT
designator R?  Resistance: 220kΩ  (hidden comment: *)
Resistor, 220kΩ, ±1%, 50mW, 25V, ±200ppm/℃, -55℃~+155℃, SMD 0201; Manufacturer: Uniroyal; Manufacturer Part Number: RHC-01W2203FT; Supplier 1: LCSC; Supplier Part Number 1: C2991607; JLCPCB Part Number: C2991607; Power Rating: 50mW; Category: Resistors; Package Size: 0201; JLCPCB Basic Part: Yes; Tolerance: ±1%; Voltage Rating: 25V; Temperature Coefficient: ±200ppm/℃; Temperature Rating: -55℃~+155℃; ComponentLink1Description: Datasheet; ComponentLink1URL: https://wmsc.lcsc.com/wmsc/upload/file/pdf/v2/lcsc/2204111630_FH--Guangdong-Fenghua-Advanced-Tech-RHC-01W2203FT_C2991607.pdf; ComponentLink2Description: JLCPCB Part URL; ComponentLink2URL: https://jlcpcb.com/partdetail/C2991607
pins: 1, 2
1 alternate drawing of the same symbol

## RHC-01W2322FT
designator R?  Resistance: 23.2kΩ  (hidden comment: *)
Resistor, 23.2kΩ, ±1%, 50mW, 25V, ±200ppm/℃, -55℃~+155℃, SMD 0201; Manufacturer: Uniroyal; Manufacturer Part Number: RHC-01W2322FT; Supplier 1: LCSC; Supplier Part Number 1: C2991574; JLCPCB Part Number: C2991574; Power Rating: 50mW; Category: Resistors; Package Size: 0201; JLCPCB Basic Part: Yes; Tolerance: ±1%; Voltage Rating: 25V; Temperature Coefficient: ±200ppm/℃; Temperature Rating: -55℃~+155℃; ComponentLink1Description: Datasheet; ComponentLink1URL: https://wmsc.lcsc.com/wmsc/upload/file/pdf/v2/lcsc/2204111815_FH--Guangdong-Fenghua-Advanced-Tech-RHC-01W2322FT_C2991574.pdf; ComponentLink2Description: JLCPCB Part URL; ComponentLink2URL: https://jlcpcb.com/partdetail/C2991574
pins: 1, 2
1 alternate drawing of the same symbol

## RHC-01W2673FT
designator R?  Resistance: 267kΩ  (hidden comment: *)
Resistor, 267kΩ, ±1%, 50mW, 25V, ±200ppm/℃, -55℃~+155℃, SMD 0201; Manufacturer: Uniroyal; Manufacturer Part Number: RHC-01W2673FT; Supplier 1: LCSC; Supplier Part Number 1: C2991659; JLCPCB Part Number: C2991659; Power Rating: 50mW; Category: Resistors; Package Size: 0201; JLCPCB Basic Part: Yes; Tolerance: ±1%; Voltage Rating: 25V; Temperature Coefficient: ±200ppm/℃; Temperature Rating: -55℃~+155℃; ComponentLink1Description: Datasheet; ComponentLink1URL: https://wmsc.lcsc.com/wmsc/upload/file/pdf/v2/lcsc/2204111815_FH--Guangdong-Fenghua-Advanced-Tech-RHC-01W2673FT_C2991659.pdf; ComponentLink2Description: JLCPCB Part URL; ComponentLink2URL: https://jlcpcb.com/partdetail/C2991659
pins: 1, 2
1 alternate drawing of the same symbol

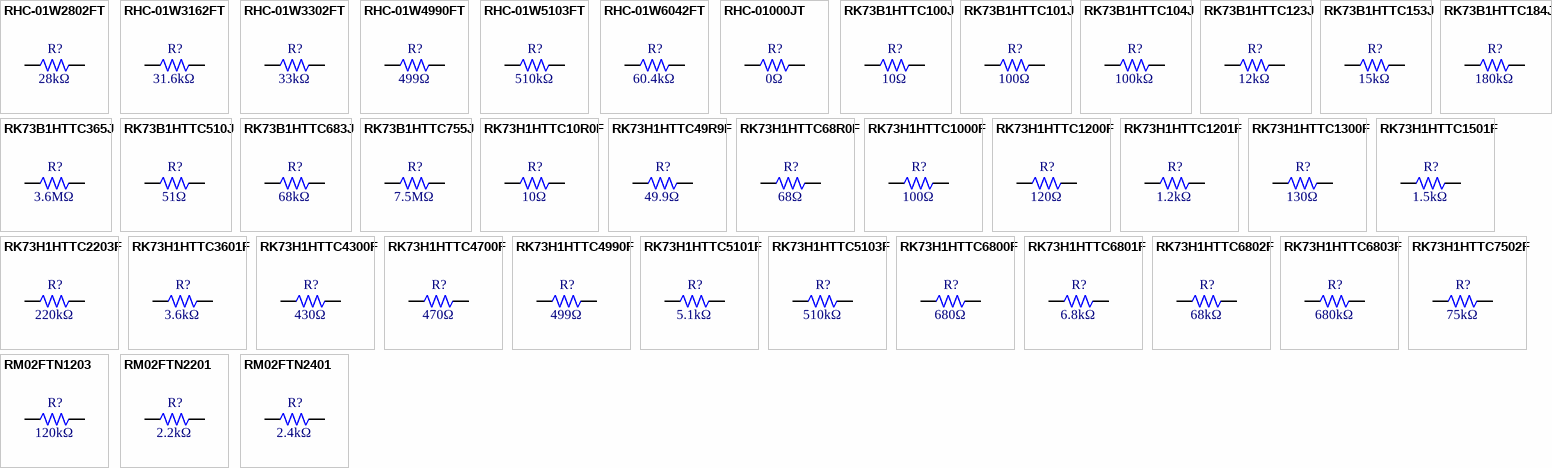
[diagram p28: symbols RHC-01W2802FT to RM02FTN2401]

## RHC-01W2802FT
designator R?  Resistance: 28kΩ  (hidden comment: *)
Resistor, 28kΩ, ±1%, 50mW, 25V, ±200ppm/℃, -55℃~+155℃, SMD 0201; Manufacturer: Uniroyal; Manufacturer Part Number: RHC-01W2802FT; Supplier 1: LCSC; Supplier Part Number 1: C2991698; JLCPCB Part Number: C2991698; Power Rating: 50mW; Category: Resistors; Package Size: 0201; JLCPCB Basic Part: Yes; Tolerance: ±1%; Voltage Rating: 25V; Temperature Coefficient: ±200ppm/℃; Temperature Rating: -55℃~+155℃; ComponentLink1Description: Datasheet; ComponentLink1URL: https://wmsc.lcsc.com/wmsc/upload/file/pdf/v2/lcsc/2204111815_FH--Guangdong-Fenghua-Advanced-Tech-RHC-01W2802FT_C2991698.pdf; ComponentLink2Description: JLCPCB Part URL; ComponentLink2URL: https://jlcpcb.com/partdetail/C2991698
pins: 1, 2
1 alternate drawing of the same symbol

## RHC-01W3162FT
designator R?  Resistance: 31.6kΩ  (hidden comment: *)
Resistor, 31.6kΩ, ±1%, 50mW, 25V, ±200ppm/℃, -55℃~+155℃, SMD 0201; Manufacturer: Uniroyal; Manufacturer Part Number: RHC-01W3162FT; Supplier 1: LCSC; Supplier Part Number 1: C2991674; JLCPCB Part Number: C2991674; Power Rating: 50mW; Category: Resistors; Package Size: 0201; JLCPCB Basic Part: Yes; Tolerance: ±1%; Voltage Rating: 25V; Temperature Coefficient: ±200ppm/℃; Temperature Rating: -55℃~+155℃; ComponentLink1Description: Datasheet; ComponentLink1URL: https://wmsc.lcsc.com/wmsc/upload/file/pdf/v2/lcsc/2204111830_FH--Guangdong-Fenghua-Advanced-Tech-RHC-01W3162FT_C2991674.pdf; ComponentLink2Description: JLCPCB Part URL; ComponentLink2URL: https://jlcpcb.com/partdetail/C2991674
pins: 1, 2
1 alternate drawing of the same symbol

## RHC-01W3302FT
designator R?  Resistance: 33kΩ  (hidden comment: *)
Resistor, 33kΩ, ±1%, 50mW, 25V, ±200ppm/℃, -55℃~+155℃, SMD 0201; Manufacturer: Uniroyal; Manufacturer Part Number: RHC-01W3302FT; Supplier 1: LCSC; Supplier Part Number 1: C2991572; JLCPCB Part Number: C2991572; Power Rating: 50mW; Category: Resistors; Package Size: 0201; JLCPCB Basic Part: Yes; Tolerance: ±1%; Voltage Rating: 25V; Temperature Coefficient: ±200ppm/℃; Temperature Rating: -55℃~+155℃; ComponentLink1Description: Datasheet; ComponentLink1URL: https://wmsc.lcsc.com/wmsc/upload/file/pdf/v2/lcsc/2204111630_FH--Guangdong-Fenghua-Advanced-Tech-RHC-01W3302FT_C2991572.pdf; ComponentLink2Description: JLCPCB Part URL; ComponentLink2URL: https://jlcpcb.com/partdetail/C2991572
pins: 1, 2
1 alternate drawing of the same symbol

## RHC-01W4990FT
designator R?  Resistance: 499Ω  (hidden comment: *)
Resistor, 499Ω, ±1%, SMD 0201; Manufacturer: Uniroyal; Manufacturer Part Number: RHC-01W4990FT; Supplier 1: LCSC; Supplier Part Number 1: C4354889; JLCPCB Part Number: C4354889; Category: Resistors; Package Size: 0201; JLCPCB Basic Part: Yes; Tolerance: ±1%; ComponentLink1Description: Datasheet; ComponentLink1URL: https://wmsc.lcsc.com/wmsc/upload/file/pdf/v2/lcsc/2207131800_FH--Guangdong-Fenghua-Advanced-Tech-RHC-01W4990FT_C4354889.pdf; ComponentLink2Description: JLCPCB Part URL; ComponentLink2URL: https://jlcpcb.com/partdetail/C4354889
pins: 1, 2
1 alternate drawing of the same symbol
